# Altium footprint library 容阻感.PcbLib: 66 footprints (part 4 of 5)
Each footprint in its own frame and in the unit in brackets; x right, y up, seen from the top. Pads: shape width x height; smd on the part's side, far side on the other; paste and mask are expansions set on the pad; w line width, h text height; cw(c..) or ccw(c..) is an arc to the next point about the centre after c.
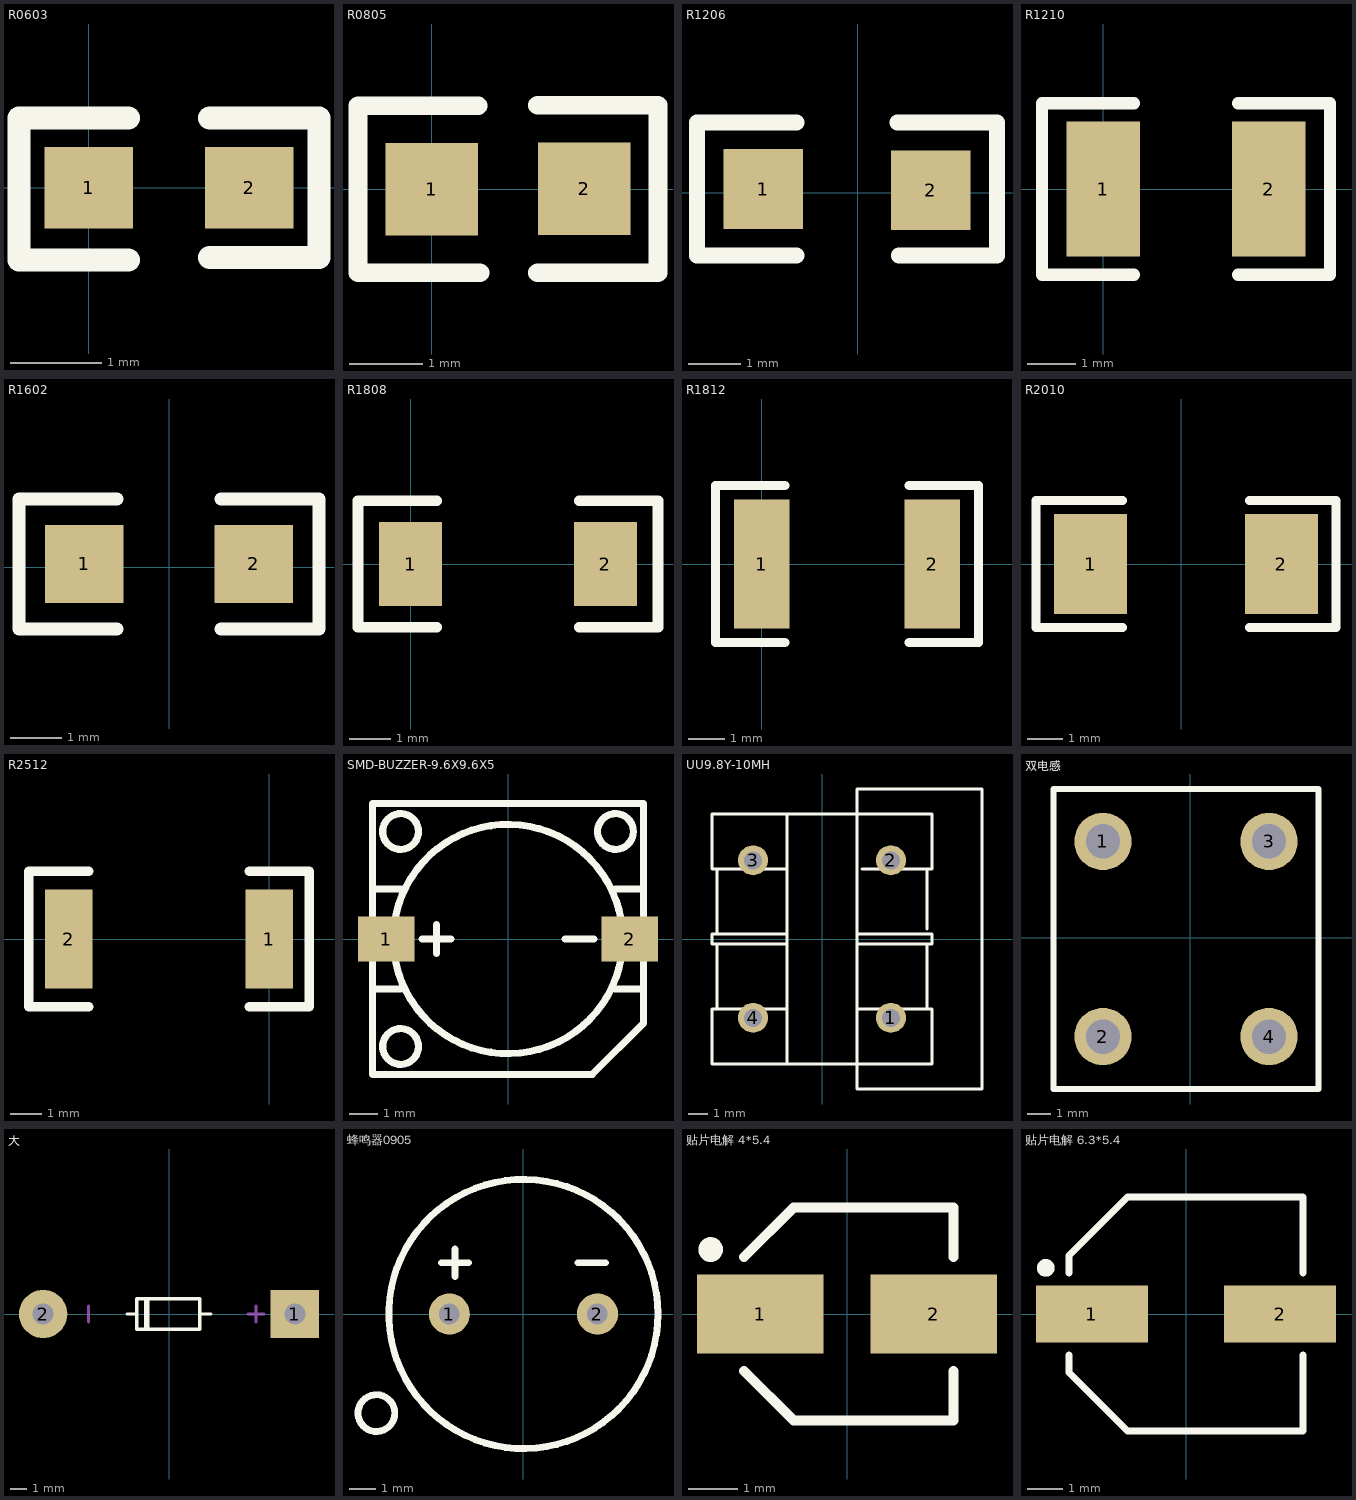
[diagram p3: the footprints below, top view; thin cyan lines are the x and y axes]

## R0603 [mil] "1/10W"
pads (2):
  rect 38x35 smd: 1(0,0) 2(69,0)
Top Overlay:
  lines w10: 17,-31 -30,-31 -30,30 17,30 ; 52,-30 99,-30 99,30 52,30
3D body "R0603.STEP": height 17.72, standoff 0, extent 3.51,-15.74 66.5,15.75

## R0805 [mm] "1/8W"
pads (2):
  rect 1.27x1.27 smd: 1(0,0) 2(2.09,0.005)
Top Overlay:
  lines w0.254: 0.635,1.143 -1.011,1.143 -1.011,-1.143 0.66,-1.143 ; 1.448,-1.143 3.099,-1.143 3.099,1.148 1.448,1.148
3D body "R0805.STEP": height 0.55, standoff 0, extent 0.036,-0.62 2.036,0.64

## R1206 [mil] "1/4W"
pads (2):
  rect 60x60 smd: 1(-71,3) 2(55,2)
Top Overlay:
  lines w12: -46,-47 -121,-47 -121,53 -46,53 ; 30,53 105,53 105,-47 31,-47
3D body "R1206.STEP": height 23.62, standoff 0, extent -70.99,-29.49 55,33.5

## R1210 [mil]
pads (2):
  rect 60x110 smd: 1(0,0) 2(135,0)
Top Overlay:
  lines w10: 25,-70 -50,-70 -50,70 25,70 ; 110,-70 185,-70 185,70 110,70
3D body "User Library-res1210.STEP": height 24.79, standoff 0, extent -18.68,-52 146.68,54.3

## R1602 [mil]
pads (2):
  rect 60x60 smd: 1(-65,2.5) 2(65,2.5)
Top Overlay:
  lines w10: -40,-47.5 -115,-47.5 -115,52.5 -40,52.5 ; 40,-47.5 115,-47.5 115,52.5 40,52.5
3D body "贴片电阻5mm.STEP": height 24.44, standoff 0, extent -115,-52.5 121.22,53.8

## R1808 [mil]
pads (2):
  rect 60x80 smd: 1(0,0) 2(185,0)
Top Overlay:
  lines w10: 25,-60 -50,-60 -50,60 25,60 ; 160,-60 235,-60 235,60 160,60
3D body "R1808(4520M)1.STEP": height 39.37, standoff 0, extent 2,-39 179.77,37.49

## R1812 [mil]
pads (2):
  rect 60x140 smd: 1(0,0) 2(185,0)
Top Overlay:
  lines w10: 25,-85 -50,-85 -50,85 25,85 ; 160,-85 235,-85 235,85 160,85
3D body "SW3dPS-1812 SMD Resistor.STEP": height 63.07, standoff 0, extent 3.42,-62 180.58,63.98

## R2010 [mil]
pads (2):
  rect 80x110 smd: 1(-100,0) 2(110,0)
Top Overlay:
  lines w10: -65,-70 -160,-70 -160,70 -65,70 ; 75,-70 170,-70 170,70 75,70
3D body "User Library-res2010.STEP": height 24.44, standoff 0, extent -112.5,-52.5 123.72,53.8

## R2512 [mil]
pads (2):
  rect 60x125 smd: 1(0,0) 2(-251.97,0)
Top Overlay:
  lines w11.81: -226.97,-85 -301.97,-85 -301.97,85 -226.97,85 ; -25,-85 50,-85 50,85 -25,85
3D body "User Library-res2512.STEP": height 25.23, standoff 0, extent -259.84,-64.96 7.87,64.96

## SMD-BUZZER-9.6X9.6X5 [mm]
pads (2):
  rect 2x1.6 smd: 1(-4.318,0) 2(4.318,0)
Top Overlay:
  circle w0.254: c0,0 r4.064
  circle w0.254: c-3.81,3.81 r0.635
  circle w0.254: c-3.81,-3.81 r0.635
  circle w0.254: c3.81,3.81 r0.635
  lines w0.254: -4.8,-1.778 -3.81,-1.778 ; -4.8,1.778 -3.81,1.778 ; -4.8,4.8 -4.8,-4.8 3,-4.8 ; -4.8,4.8 4.801,4.8 4.801,-3 ; -3.048,0 -2.032,0 ; -2.54,-0.508 -2.54,0.508 ; 2.032,0 3.048,0 ; 3,-4.79 4.801,-2.99 ; 3.8,-1.778 4.8,-1.778 ; 3.81,1.778 4.8,1.778

## UU9.8Y-10MH [mil]
pads (4):
  round 60 hole 36: 1(137.8,-157.5) 2(137.8,157.5) 3(-137.8,157.5) 4(-137.8,-157.5)
Top Overlay:
  lines w6: -210,-10 -210,-140 -70,-140 ; -210,10 -210,140 ; -200,-140 -220,-140 -220,-250 -70,-250 ; -70,10 -220,10 -220,-10 -70,-10 ; -70,140 -220,140 -220,250 -70,250 ; 70,-240 70,-140 220,-140 220,-250 210,-250 70,-250 ; 70,-10 220,-10 220,10 70,10 ; 80,140 220,140 220,250 ; 210,-140 210,-10 ; 210,20 210,140 ; 210,250 220,250 ; -70,-250 -70,250 ; -70,-250 70,-250 ; -70,-10 -70,-10 ; -70,250 70,250 ; 70,-250 70,250 ; 70,-250 70,-300 320,-300 320,300 70,300 70,250 ; 70,250 220,250

## 双电感 [mm]
pads (4):
  round 2.5 hole 1.5: 1(-3.81,4.191) 2(-3.81,-4.318) 3(3.429,4.191) 4(3.429,-4.318)
Top Overlay:
  lines w0.254: -5.969,-6.604 -5.969,6.477 5.588,6.477 5.588,-6.604 -5.969,-6.604
3D body "SW3dPS-INDUCTOR, COMMON MODE, 22MH PER SIDE, WAH HING CG00008A.STEP": height 15.45, standoff -3, extent -5.77,-7.689 5.08,7.874

## 大 [mm]
pads (2):
  rect 3x3 hole 1.3: 1(7.81,0)
  round 3 hole 1.3: 2(-7.81,0)
Top Overlay:
  lines w0.2: -2.6,0 -2.001,0 ; -1.448,-0.95 -1.448,0.95 ; -1.3,-0.95 -1.3,0.95 ; 1.899,-0.95 -2.001,-0.95 -2.001,0.95 1.899,0.95 ; 1.911,-0.95 1.911,0.95 ; 1.911,0 2.6,0
Mechanical 15:
  lines w0.203: -5,-0.5 -5,0.5 ; 4.9,0 5.9,0 ; 5.4,-0.5 5.4,0.5
3D body "DO-35.STEP": height 1.92, standoff -1.9, extent -4.098,-0.888 4.072,0.914

## 蜂鸣器0905 [mil]
pads (2):
  round 60 hole 30: 1(-108.27,0) 2(108.27,0)
Top Overlay:
  circle w10: c-215,-145 r26.93
  circle w10: c0,0 r196.85
  lines w10: -120,75 -80,75 ; -100,55 -100,95 ; 80,75 120,75

## 贴片电解 4*5.4 [mm] "贴片电解 4*5.4"
pads (2):
  rect 2.55x1.6 smd: 1(-1.75,0) 2(1.75,0)
Top Overlay:
  circle w0.25: c-2.75,1.3 r0.125
  lines w0.2: -2.075,-1.15 -1.075,-2.15 2.15,-2.15 2.15,-1.15 ; -2.075,1.15 -1.075,2.15 2.15,2.15 2.15,1.15

## 贴片电解 6.3*5.4 [mm] "贴片电解 6.3*5.4"
pads (2):
  rect 3.15x1.6 smd: 1(-2.65,0) 2(2.65,0)
Top Overlay:
  circle w0.25: c-3.95,1.3 r0.125
  lines w0.2: -3.3,-1.15 -3.3,-1.65 -1.65,-3.3 3.3,-3.3 3.3,-1.15 ; -3.3,1.15 -3.3,1.65 -1.65,3.3 3.3,3.3 3.3,1.15
3D body "User Library-ALU-D.STEP": height 5.4, standoff 0, extent -3.5,-3.3 3.5,3.3